# Altium footprint library Connectors.PcbLib: 155 footprints (part 9 of 10)
Each footprint in its own frame and in the unit in brackets; x right, y up, seen from the top. Pads: shape width x height; smd on the part's side, far side on the other; paste and mask are expansions set on the pad; w line width, h text height; cw(c..) or ccw(c..) is an arc to the next point about the centre after c.
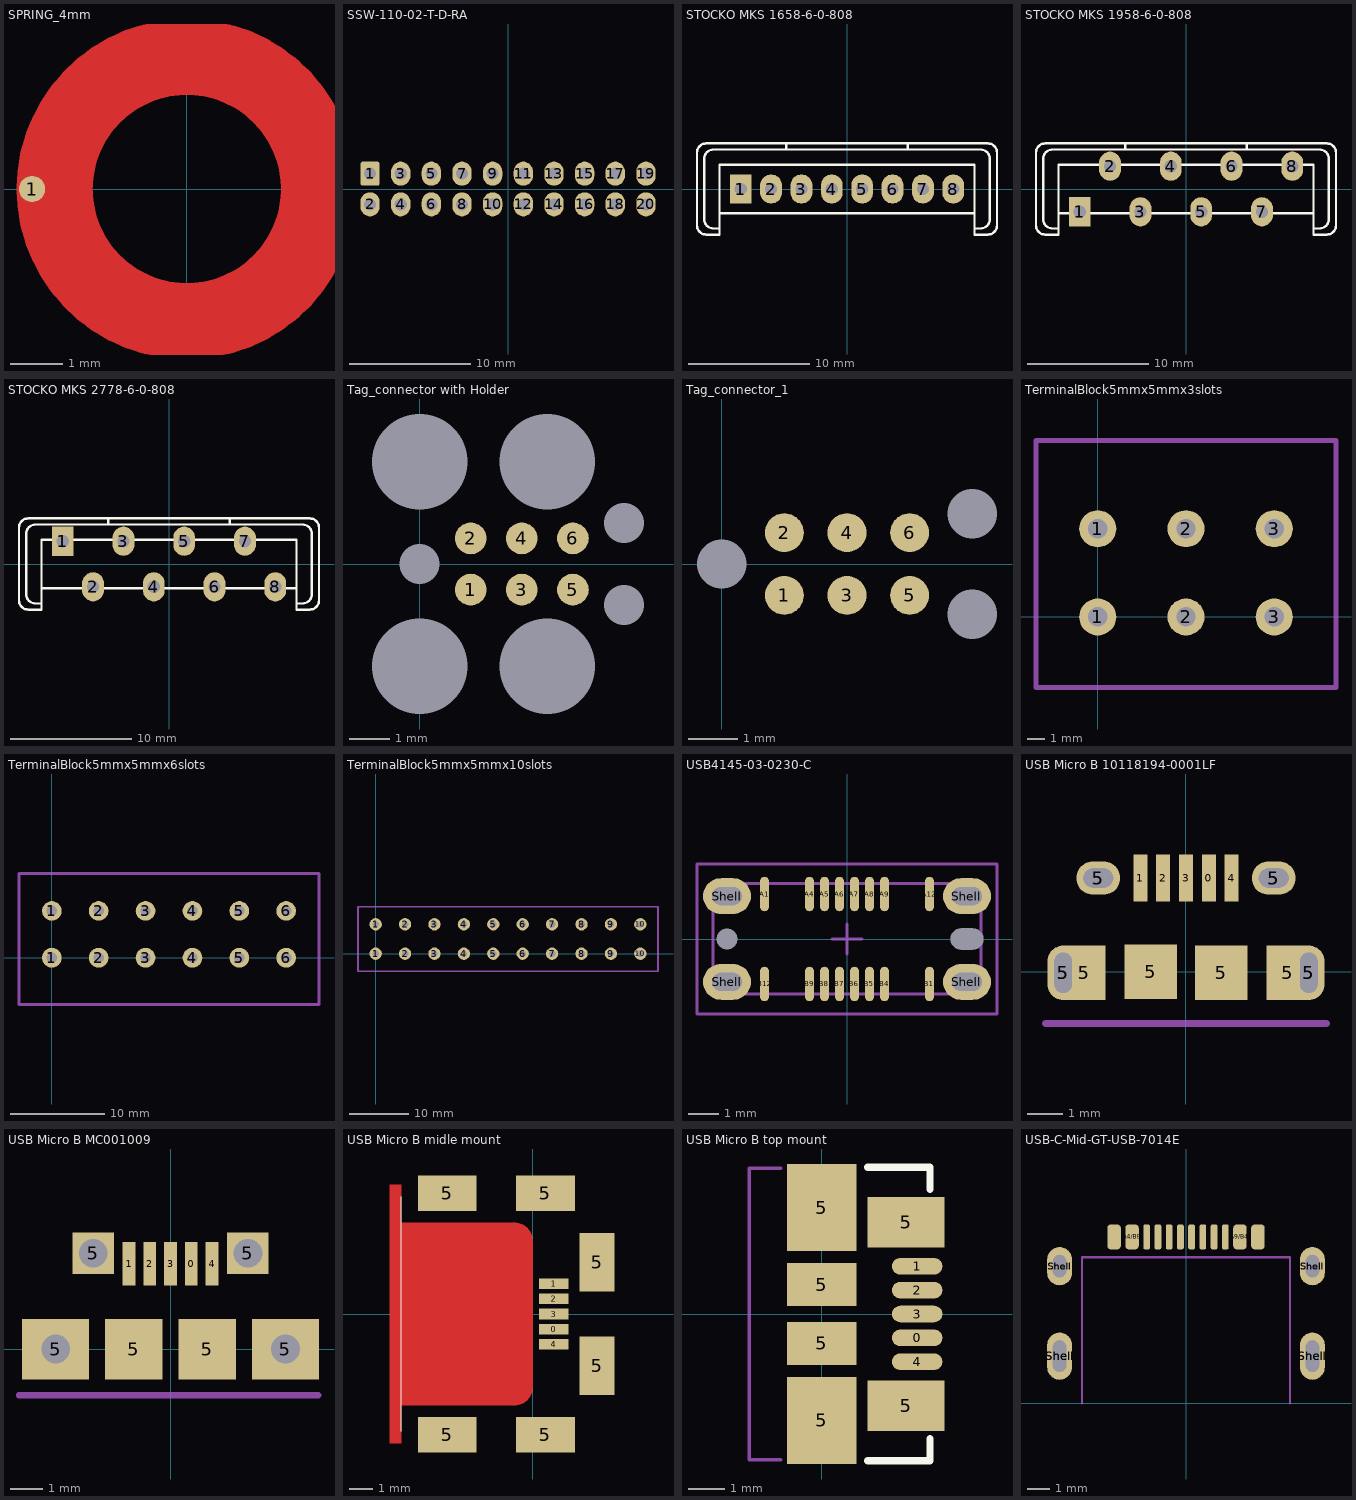
[diagram p8: the footprints below, top view; thin cyan lines are the x and y axes]

## SPRING_4mm [mm] "SaFa spring, 4-5.6mm diameter"
height 10
pads (1):
  round 0.5 smd paste-2: 1(-2.95,0)
Top Layer:
  circle w1.45: c0,0 r2.52
Top Solder:
  circle w1.65: c0,0 r2.52

## SSW-110-02-T-D-RA [mm] "SSW-110-02-T-D-RA"
height 5
pads (20):
  rrect25% 1.6x2 hole 1: 1(-11.43,1.27)
  oval 1.6x2 hole 1: 2(-11.43,-1.27) 3(-8.89,1.27) 4(-8.89,-1.27) 5(-6.35,1.27) 6(-6.35,-1.27) 7(-3.81,1.27) 8(-3.81,-1.27) 9(-1.27,1.27) 10(-1.27,-1.27) 11(1.27,1.27) 12(1.27,-1.27) 13(3.81,1.27) 14(3.81,-1.27) 15(6.35,1.27) 16(6.35,-1.27) 17(8.89,1.27) 18(8.89,-1.27) 19(11.43,1.27) 20(11.43,-1.27)
3D body: height 4.98, standoff -2.52, extent -12.979,-11.303 12.929,1.473

## STOCKO MKS 1658-6-0-808 [mm] "MKS 1658-6-0-808"
height 14
pads (8):
  rect 1.8x2.4 hole 1: 1(-8.75,0)
  oval 1.8x2.4 hole 1: 2(-6.25,0) 3(-3.75,0) 4(-1.25,0) 5(1.25,0) 6(3.75,0) 7(6.25,0) 8(8.75,0)
Top Overlay:
  lines w0.2: -11.75,2.5 cw(c-11,2.5) -11,3.25 11,3.25 cw(c11,2.5) 11.75,2.5 11.75,-2.5 cw(c11,-2.5) 11,-3.25 10.5,-3.25 ; -11.75,2.575 -11.75,-2.5 ccw(c-11,-2.5) -11,-3.25 -10.5,-3.25 ; -5,3.25 -5,3.75 ; 5,3.25 5,3.75 ; -10.5,-2 10.5,-2 ; -10.5,-2 -10.5,2 10.5,2 10.5,-2 ; -10.5,-2 -10.5,-3.75 -11.6,-3.75 cw(c-11.6,-3) -12.35,-3 -12.35,3 cw(c-11.6,3) -11.6,3.75 11.6,3.75 cw(c11.6,3) 12.35,3 12.35,-3 cw(c11.6,-3) 11.6,-3.75 10.5,-3.75 10.5,-2

## STOCKO MKS 1958-6-0-808 [mm] "MKS 1958-6-0-808"
height 14
pads (8):
  rect 1.8x2.4 hole 1: 1(-8.75,-1.875)
  oval 1.8x2.4 hole 1: 2(-6.25,1.875) 3(-3.75,-1.875) 4(-1.25,1.875) 5(1.25,-1.875) 6(3.75,1.875) 7(6.25,-1.875) 8(8.75,1.875)
Top Overlay:
  lines w0.2: -11.75,2.5 cw(c-11,2.5) -11,3.25 11,3.25 cw(c11,2.5) 11.75,2.5 11.75,-2.5 cw(c11,-2.5) 11,-3.25 10.5,-3.25 ; -11.75,2.575 -11.75,-2.5 ccw(c-11,-2.5) -11,-3.25 -10.5,-3.25 ; -5,3.25 -5,3.75 ; 5,3.25 5,3.75 ; -10.5,-2 10.5,-2 ; -10.5,-2 -10.5,2 10.5,2 10.5,-2 ; -10.5,-2 -10.5,-3.75 -11.6,-3.75 cw(c-11.6,-3) -12.35,-3 -12.35,3 cw(c-11.6,3) -11.6,3.75 11.6,3.75 cw(c11.6,3) 12.35,3 12.35,-3 cw(c11.6,-3) 11.6,-3.75 10.5,-3.75 10.5,-2

## STOCKO MKS 2778-6-0-808 [mm] "MKS 2778-6-0-808"
height 7.5
pads (8):
  rect 1.8x2.4 hole 1: 1(-8.75,1.875)
  oval 1.8x2.4 hole 1: 2(-6.25,-1.875) 3(-3.75,1.875) 4(-1.25,-1.875) 5(1.25,1.875) 6(3.75,-1.875) 7(6.25,1.875) 8(8.75,-1.875)
Top Overlay:
  lines w0.2: -11.75,2.5 cw(c-11,2.5) -11,3.25 11,3.25 cw(c11,2.5) 11.75,2.5 11.75,-2.5 cw(c11,-2.5) 11,-3.25 10.5,-3.25 ; -11.75,2.575 -11.75,-2.5 ccw(c-11,-2.5) -11,-3.25 -10.5,-3.25 ; -5,3.25 -5,3.75 ; 5,3.25 5,3.75 ; -10.5,-2 -10.5,-3.75 -11.6,-3.75 cw(c-11.6,-3) -12.35,-3 -12.35,3 cw(c-11.6,3) -11.6,3.75 11.6,3.75 cw(c11.6,3) 12.35,3 12.35,-3 cw(c11.6,-3) 11.6,-3.75 10.5,-3.75 10.5,-2 ; -10.5,-2 -10.5,2 10.5,2 10.5,-2 ; -10.5,-2 10.5,-2

## Tag_connector with Holder [mil] "Programming pads"
pads (13):
  round 0 hole 93.5 unplated: 0(0,-100) 0(0,100) 0(125,-100) 0(125,100)
  round 0 hole 39.37 unplated: 0(0,0) 0(200,-40) 0(200,40)
  round 31 smd paste-39.37: 1(50,-25) 2(50,25) 3(100,-25) 5(150,-25) 6(150,25)
  round 31 smd paste-39.37 mask+4: 4(100,25)

## Tag_connector_1 [mil] "Programming pads"
pads (9):
  round 0 hole 39.37 unplated: 0(0,0) 0(200,-40) 0(200,40)
  round 31 smd paste-39.37: 1(50,-25) 2(50,25) 3(100,-25) 5(150,-25) 6(150,25)
  round 31 smd paste-39.37 mask+4: 4(100,25)

## TerminalBlock5mmx5mmx3slots [mm]
pads (6):
  round 2.1 hole 1.1: 1(0,0) 1(0,5) 2(5,0) 2(5,5) 3(10,0) 3(10,5)
Mechanical 1:
  lines w0.3: -3.5,-4 13.5,-4 13.5,10 -3.5,10 -3.5,-4

## TerminalBlock5mmx5mmx6slots [mm] "Wago 236-406"
pads (12):
  round 2.1 hole 1.1: 1(0,0) 1(0,5) 2(5,0) 2(5,5) 3(10,0) 3(10,5) 4(15,0) 4(15,5) 5(20,0) 5(20,5) 6(25,0) 6(25,5)
Mechanical 1:
  lines w0.3: -3.5,-5 -3.5,9 28.5,9 28.5,-5 -3.5,-5

## TerminalBlock5mmx5mmx10slots [mm]
pads (20):
  round 2.1 hole 1.1: 1(0,0) 1(0,5) 2(5,0) 2(5,5) 3(10,0) 3(10,5) 4(15,0) 4(15,5) 5(20,0) 5(20,5) 6(25,0) 6(25,5) 7(30,0) 7(30,5) 8(35,0) 8(35,5) 9(40,0) 9(40,5) 10(45,0) 10(45,5)
Mechanical 1:
  lines w0.3: -3,-3 -3,8 48,8 48,-3 -3,-3

## USB4145-03-0230-C [mm] "USB-C Vertical 2.0 receptacle for 1.6mm PCB"
height 7.46
pads (22):
  round 0 hole 0.7 unplated: 0(-4,0)
  round 0 hole 0.7 slot 1.1 at 0 deg unplated: 0(4,0)
  oval 0.3x1.15 smd: A1(-2.75,1.5) A4(-1.25,1.5) A5(-0.75,1.5) A6(-0.25,1.5) A7(0.25,1.5) A8(0.75,1.5) A9(1.25,1.5) A12(2.75,1.5) B1(2.75,-1.5) B4(1.25,-1.5) B5(0.75,-1.5) B6(0.25,-1.5) B7(-0.25,-1.5) B8(-0.75,-1.5) B9(-1.25,-1.5) B12(-2.75,-1.5)
  oval 1.6x1.2 hole 0.6 slot 1 at 0 deg: Shell(-4,-1.43) Shell(-4,1.43) Shell(4,-1.43) Shell(4,1.43)
Mechanical 13:
  lines w0.1: -4.473,-1.84 -4.473,1.85 4.473,1.85 4.473,-1.84 -4.473,-1.84
Mechanical 15:
  lines w0.1: -0.5,0 0.5,0 ; 0,-0.5 0,0.5 ; -5,-2.5 -5,2.5 5,2.5 5,-2.5 -5,-2.5
3D body: height 7.46, standoff -2.3, extent -4.473,-1.84 4.473,1.85

## USB Micro B 10118194-0001LF [mm] "Micro USB, solder-in-paste, 4 corner fixing"
pads (17):
  rect 0.4x1.35 smd: 0(0.65,2.675) 1(-1.3,2.675) 2(-0.65,2.675) 3(0,2.675) 4(1.3,2.675)
  oval 0.9x1.55 smd: 5(-3.5,-0.025) 5(3.5,-0.025)
  oval 0.9x1.55 hole 0.5 slot 1.15 at 90 deg: 5(-3.5,-0.025) 5(3.5,-0.025)
  rect 1.2x1.55 smd: 5(-2.9,-0.025) 5(2.9,-0.025)
  oval 1.25x0.95 smd: 5(-2.5,2.675) 5(2.5,2.675)
  oval 1.25x0.95 hole 0.55 slot 0.85 at 0 deg: 5(-2.5,2.675) 5(2.5,2.675)
  rect 1.5x1.55 smd: 5(-1,0) 5(1,-0.025)
Mechanical 15:
  lines w0.2: -4,-1.475 4,-1.475
3D body: height 2.68, standoff -0.6, extent -4.025,-2.725 4.025,2.855

## USB Micro B MC001009 [mm] "MC001009"
pads (11):
  rect 0.4x1.35 smd: 0(0.65,2.675) 1(-1.3,2.675) 2(-0.65,2.675) 3(0,2.675) 4(1.3,2.675)
  rect 2.1x1.9 hole 0.9 unplated: 5(-3.6,0) 5(3.6,0)
  rect 1.3x1.3 hole 0.9 unplated: 5(-2.425,3) 5(2.425,3)
  rect 1.8x1.9 smd: 5(-1.15,0) 5(1.15,0)
Mechanical 15:
  lines w0.2: -4.75,-1.45 4.625,-1.45
3D body: height 2.68, standoff -0.26, extent -3.99,-2.58 3.99,2.85

## USB Micro B midle mount [mm] "USB Micro B midle mount"
height 2.45
pads (11):
  rect 1.25x0.45 smd: 0(0.9,-0.65) 1(0.9,1.3) 2(0.9,0.65) 3(0.9,0) 4(0.9,-1.3)
  rect 2.5x1.5 smd: 5(-3.65,-5.15) 5(-3.65,5.15) 5(0.55,-5.15) 5(0.55,5.15)
  rect 1.5x2.5 smd: 5(2.75,-2.2) 5(2.75,2.2)
Top Layer:
  pour cut-out: -5.6,-3.9 -0.787,-3.907 -0.582,-3.88 -0.39,-3.8 -0.226,-3.674 -0.1,-3.51 -0.02,-3.318 0.007,-3.113 0,-3.113 0.007,3.113 -0.02,3.318 -0.1,3.51 -0.226,3.674 -0.39,3.8 -0.582,3.88 -0.787,3.907 -0.787,3.9 -5.6,3.9 -5.6,5.525 -6.1,5.525 -6.1,-5.525 -5.6,-5.525
Top Overlay:
  lines w0.01: -5.6,-5 -5.6,5
3D body: height 1.47, standoff -1.47, extent -6.03,-5.5 3.1,5.5

## USB Micro B top mount [mm] "USB Micro B top mount"
height 2.45
pads (11):
  oval 1.38x0.45 smd: 0(2.6,-0.65) 1(2.6,1.3) 2(2.6,0.65) 3(2.6,0) 4(2.6,-1.3)
  rect 1.9x2.375 smd: 5(0,-2.9) 5(0,2.9)
  rect 1.9x1.175 smd: 5(0,-0.8) 5(0,0.8)
  rect 2.1x1.375 smd: 5(2.3,-2.5) 5(2.3,2.5)
Top Overlay:
  lines w0.2: 1.25,-4 2.95,-4 2.95,-3.4 ; 1.25,4 2.95,4 2.95,3.4
Mechanical 15:
  lines w0.1: -1.125,-3.975 -1.975,-3.975 -1.975,3.975 -1.125,3.975
3D body: height 2.68, standoff -0.26, extent -2.48,-3.99 2.95,3.99

## USB-C-Mid-GT-USB-7014E [mm] "GT-USB-7014E mid mount, economy"
height 2.62
pads (24):
  rrect50% 0.6x1.1 smd: A1/B12(-3.2,7.4) A4/B9(-2.4,7.4) A9/B4(2.4,7.4) A12/B1(3.2,7.4)
  rrect50% 0.3x1.1 smd: A5(-1.25,7.4) A6(-0.25,7.4) A7(0.25,7.4) A8(1.25,7.4) B5(1.75,7.4) B6(0.75,7.4) B7(-0.75,7.4) B8(-1.75,7.4)
  oval 1.1x2.1 smd: Shell(-5.62,2.1) Shell(5.62,2.1)
  oval 1.1x2.1 hole 0.6 slot 1.4 at 90 deg: Shell(-5.62,2.1) Shell(5.62,2.1)
  oval 1.1x2.1 on Top Paste: Shell(-5.62,2.1) Shell(5.62,2.1)
  oval 1.1x1.7 smd: Shell(-5.62,6.1) Shell(5.62,6.1)
  oval 1.1x1.7 hole 0.6 slot 1 at 90 deg: Shell(-5.62,6.1) Shell(5.62,6.1)
  oval 1.1x1.7 on Top Paste: Shell(-5.62,6.1) Shell(5.62,6.1)
Mechanical 13:
  lines w0.1: -4.625,0 -4.625,6.5 4.625,6.5 4.625,0
3D body: height 2.62, standoff -0.54, extent -5.775,0 5.775,7.201